# Altium footprint library microbuilder.PCBLIB: 422 footprints (part 22 of 27)
Each footprint in its own frame and in the unit in brackets; x right, y up, seen from the top. Pads: shape width x height; smd on the part's side, far side on the other; paste and mask are expansions set on the pad; w line width, h text height; cw(c..) or ccw(c..) is an arc to the next point about the centre after c.
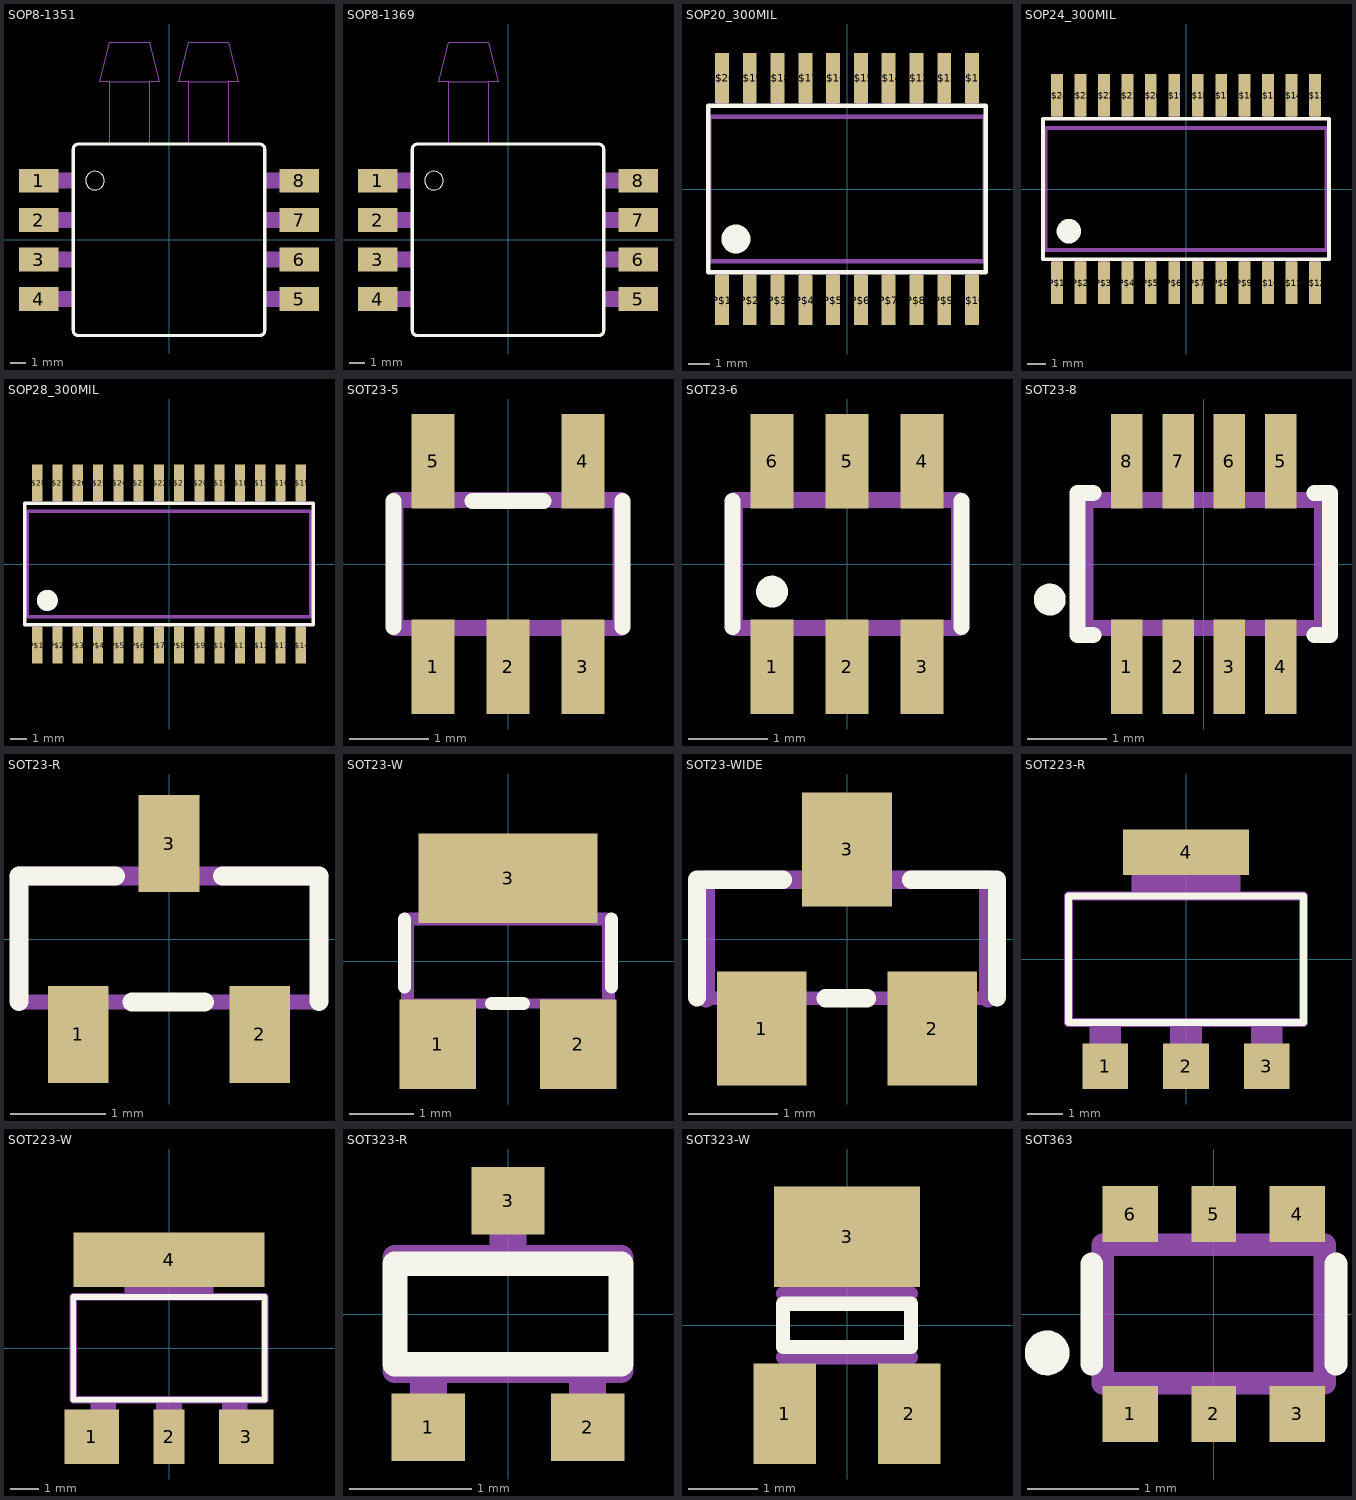
[diagram p21: the footprints below, top view; thin cyan lines are the x and y axes]

## SOP8-1351 [mil]
pads (8):
  rect 100x60 smd: 1(-330,150) 2(-330,50) 3(-330,-50) 4(-330,-150) 5(330,-150) 6(330,-50) 7(330,50) 8(330,150)
Top Overlay:
  circle w0: c-187.5,150 r23.58
  lines w8: -242.5,-230 ccw(c-230,-230) -230,-242.5 230,-242.5 ccw(c230,-230) 242.5,-230 242.5,230 ccw(c230,230) 230,242.5 -230,242.5 ccw(c-230,230) -242.5,230 -242.5,-230
Mechanical 16:
  rectangle: -350,130 -245,170
  region: 350,170 245,170 245,130 350,130
  rectangle: -350,30 -245,70
  rectangle: -350,-70 -245,-30
  rectangle: -350,-170 -245,-130
  region: 350,70 245,70 245,30 350,30
  region: 350,-30 245,-30 245,-70 350,-70
  region: 350,-130 245,-130 245,-170 350,-170
  lines w2: -150,245 -150,400 ; -50,245 -50,400 ; 50,245 50,400 ; 150,245 150,400 ; -150,400 -175,400 -150,500 -50,500 -25,400 -50,400 ; -150,400 -50,400 ; 50,400 25,400 50,500 150,500 175,400 150,400 ; 50,400 150,400

## SOP8-1369 [mil]
pads (8):
  rect 100x60 smd: 1(-330,150) 2(-330,50) 3(-330,-50) 4(-330,-150) 5(330,-150) 6(330,-50) 7(330,50) 8(330,150)
Top Overlay:
  circle w0: c-187.5,150 r23.58
  lines w8: -242.5,-230 ccw(c-230,-230) -230,-242.5 230,-242.5 ccw(c230,-230) 242.5,-230 242.5,230 ccw(c230,230) 230,242.5 -230,242.5 ccw(c-230,230) -242.5,230 -242.5,-230
Mechanical 16:
  rectangle: -350,130 -245,170
  region: 350,170 245,170 245,130 350,130
  rectangle: -350,30 -245,70
  rectangle: -350,-70 -245,-30
  rectangle: -350,-170 -245,-130
  region: 350,70 245,70 245,30 350,30
  region: 350,-30 245,-30 245,-70 350,-70
  region: 350,-130 245,-130 245,-170 350,-170
  lines w2: -150,245 -150,400 ; -50,245 -50,400 ; -150,400 -175,400 -150,500 -50,500 -25,400 -50,400 ; -150,400 -50,400

## SOP20_300MIL [mil]
pads (20):
  rect 25x90 smd: P$1(-225,-200) P$2(-175,-200) P$3(-125,-200) P$4(-75,-200) P$5(-25,-200) P$6(25,-200) P$7(75,-200) P$8(125,-200) P$9(175,-200) P$10(225,-200) P$11(225,200) P$12(175,200) P$13(125,200) P$14(75,200) P$15(25,200) P$16(-25,200) P$17(-75,200) P$18(-125,200) P$19(-175,200) P$20(-225,200)
Top Overlay:
  circle w32: c-200,-90 r10
  lines w8: -250,-150 -250,150 250,150 250,-150 -250,-150
Mechanical 16:
  rectangle: -235,-220 -215,-152.5
  rectangle: -185,-220 -165,-152.5
  rectangle: -135,-220 -115,-152.5
  rectangle: -85,-220 -65,-152.5
  rectangle: -35,-220 -15,-152.5
  rectangle: 15,-220 35,-152.5
  rectangle: 65,-220 85,-152.5
  rectangle: 115,-220 135,-152.5
  rectangle: 165,-220 185,-152.5
  rectangle: 215,-220 235,-152.5
  region: 235,220 215,220 215,152.5 235,152.5
  region: 185,220 165,220 165,152.5 185,152.5
  region: 135,220 115,220 115,152.5 135,152.5
  region: 85,220 65,220 65,152.5 85,152.5
  region: 35,220 15,220 15,152.5 35,152.5
  region: -15,220 -35,220 -35,152.5 -15,152.5
  region: -65,220 -85,220 -85,152.5 -65,152.5
  region: -115,220 -135,220 -135,152.5 -115,152.5
  region: -165,220 -185,220 -185,152.5 -165,152.5
  region: -215,220 -235,220 -235,152.5 -215,152.5
  lines w5: -250,-150 -250,150 250,150 250,-150 -250,-150
  lines w8: -248,-130 -248,130 248,130 248,-130 -248,-130

## SOP24_300MIL [mil]
pads (24):
  rect 25x90 smd: P$1(-275,-200) P$2(-225,-200) P$3(-175,-200) P$4(-125,-200) P$5(-75,-200) P$6(-25,-200) P$7(25,-200) P$8(75,-200) P$9(125,-200) P$10(175,-200) P$11(225,-200) P$12(275,-200) P$13(275,200) P$14(225,200) P$15(175,200) P$16(125,200) P$17(75,200) P$18(25,200) P$19(-25,200) P$20(-75,200) P$21(-125,200) P$22(-175,200) P$23(-225,200) P$24(-275,200)
Top Overlay:
  circle w32: c-250,-90 r10
  lines w8: -305,-150 -305,150 305,150 305,-150 -305,-150
Mechanical 16:
  rectangle: -285,-220 -265,-152.5
  rectangle: -235,-220 -215,-152.5
  rectangle: -185,-220 -165,-152.5
  rectangle: -135,-220 -115,-152.5
  rectangle: -85,-220 -65,-152.5
  rectangle: -35,-220 -15,-152.5
  rectangle: 15,-220 35,-152.5
  rectangle: 65,-220 85,-152.5
  rectangle: 115,-220 135,-152.5
  rectangle: 165,-220 185,-152.5
  rectangle: 215,-220 235,-152.5
  rectangle: 265,-220 285,-152.5
  region: 285,220 265,220 265,152.5 285,152.5
  region: 235,220 215,220 215,152.5 235,152.5
  region: 185,220 165,220 165,152.5 185,152.5
  region: 135,220 115,220 115,152.5 135,152.5
  region: 85,220 65,220 65,152.5 85,152.5
  region: 35,220 15,220 15,152.5 35,152.5
  region: -15,220 -35,220 -35,152.5 -15,152.5
  region: -65,220 -85,220 -85,152.5 -65,152.5
  region: -115,220 -135,220 -135,152.5 -115,152.5
  region: -165,220 -185,220 -185,152.5 -165,152.5
  region: -215,220 -235,220 -235,152.5 -215,152.5
  region: -265,220 -285,220 -285,152.5 -265,152.5
  lines w5: -305,-150 -305,150 305,150 305,-150 -305,-150
  lines w8: -299,-130 -299,130 299,130 299,-130 -299,-130

## SOP28_300MIL [mil]
pads (28):
  rect 25x90 smd: P$1(-325,-200) P$2(-275,-200) P$3(-225,-200) P$4(-175,-200) P$5(-125,-200) P$6(-75,-200) P$7(-25,-200) P$8(25,-200) P$9(75,-200) P$10(125,-200) P$11(175,-200) P$12(225,-200) P$13(275,-200) P$14(325,-200) P$15(325,200) P$16(275,200) P$17(225,200) P$18(175,200) P$19(125,200) P$20(75,200) P$21(25,200) P$22(-25,200) P$23(-75,200) P$24(-125,200) P$25(-175,200) P$26(-225,200) P$27(-275,200) P$28(-325,200)
Top Overlay:
  circle w32: c-300,-90 r10
  lines w8: -356,-150 356,-150 356,150 -356,150 -356,-150
Mechanical 16:
  region: -315,220 -335,220 -335,152.5 -315,152.5
  region: -265,220 -285,220 -285,152.5 -265,152.5
  region: -215,220 -235,220 -235,152.5 -215,152.5
  region: -165,220 -185,220 -185,152.5 -165,152.5
  region: -115,220 -135,220 -135,152.5 -115,152.5
  region: -65,220 -85,220 -85,152.5 -65,152.5
  region: -15,220 -35,220 -35,152.5 -15,152.5
  region: 35,220 15,220 15,152.5 35,152.5
  region: 85,220 65,220 65,152.5 85,152.5
  region: 135,220 115,220 115,152.5 135,152.5
  region: 185,220 165,220 165,152.5 185,152.5
  region: 235,220 215,220 215,152.5 235,152.5
  region: 285,220 265,220 265,152.5 285,152.5
  region: 335,220 315,220 315,152.5 335,152.5
  rectangle: 315,-220 335,-152.5
  rectangle: 265,-220 285,-152.5
  rectangle: 215,-220 235,-152.5
  rectangle: 165,-220 185,-152.5
  rectangle: 115,-220 135,-152.5
  rectangle: 65,-220 85,-152.5
  rectangle: 15,-220 35,-152.5
  rectangle: -35,-220 -15,-152.5
  rectangle: -85,-220 -65,-152.5
  rectangle: -135,-220 -115,-152.5
  rectangle: -185,-220 -165,-152.5
  rectangle: -235,-220 -215,-152.5
  rectangle: -285,-220 -265,-152.5
  rectangle: -335,-220 -315,-152.5
  lines w5: -356,-150 356,-150 356,150 -356,150 -356,-150
  lines w8: -349,-130 349,-130 349,130 -349,130 -349,-130

## SOT23-5 [mm]
pads (5):
  rect 0.55x1.2 smd: 1(-0.95,-1.3) 2(0,-1.3) 3(0.95,-1.3) 4(0.95,1.3) 5(-0.95,1.3)
Top Overlay:
  lines w0.203: -1.45,-0.8 -1.45,0.8 ; -0.45,0.8 0.45,0.8 ; 1.45,-0.8 1.45,0.8
Mechanical 16:
  rectangle: -1.2,0.85 -0.7,1.5
  rectangle: 0.7,0.85 1.2,1.5
  rectangle: 0.7,-1.5 1.2,-0.85
  rectangle: -0.25,-1.5 0.25,-0.85
  rectangle: -1.2,-1.5 -0.7,-0.85
  lines w0.203: -1.422,-0.811 -1.422,0.811 1.422,0.811 1.422,-0.811 -1.422,-0.811

## SOT23-6 [mm]
pads (6):
  rect 0.55x1.2 smd: 1(-0.95,-1.3) 2(0,-1.3) 3(0.95,-1.3) 4(0.95,1.3) 5(0,1.3) 6(-0.95,1.3)
Top Overlay:
  circle w0.203: c-0.95,-0.35 r0.1
  lines w0.203: -1.45,-0.8 -1.45,0.8 ; 1.45,-0.8 1.45,0.8
Mechanical 16:
  rectangle: -1.2,-1.5 -0.7,-0.85
  rectangle: -0.25,-1.5 0.25,-0.85
  rectangle: 0.7,-1.5 1.2,-0.85
  rectangle: 0.7,0.85 1.2,1.5
  rectangle: -0.25,0.85 0.25,1.5
  rectangle: -1.2,0.85 -0.7,1.5
  lines w0.203: -1.422,-0.81 1.422,-0.81 1.422,0.81 -1.422,0.81 -1.422,-0.81

## SOT23-8 [mm]
pads (8):
  rect 0.4x1.2 smd: 1(-0.975,-1.3) 2(-0.325,-1.3) 3(0.325,-1.3) 4(0.975,-1.3) 5(0.975,1.3) 6(0.325,1.3) 7(-0.325,1.3) 8(-0.975,1.3)
Top Overlay:
  circle w0.203: c-1.95,-0.45 r0.1
  lines w0.203: -1.4,-0.9 -1.6,-0.9 -1.6,0.9 -1.4,0.9 ; 1.4,-0.9 1.6,-0.9 1.6,0.9 1.4,0.9
Mechanical 16:
  rectangle: -1.165,0.875 -0.785,1.5
  rectangle: -1.165,-1.5 -0.785,-0.875
  rectangle: -0.515,-1.5 -0.135,-0.875
  rectangle: 0.135,-1.5 0.515,-0.875
  rectangle: 0.785,-1.5 1.165,-0.875
  rectangle: 0.785,0.875 1.165,1.5
  rectangle: 0.135,0.875 0.515,1.5
  rectangle: -0.515,0.875 -0.135,1.5
  lines w0.203: -1.5,-0.81 1.5,-0.81 1.5,0.81 -1.5,0.81 -1.5,-0.81

## SOT23-R [mm]
pads (3):
  rect 0.635x1.016 smd: 1(-0.95,-1) 2(0.95,-1) 3(0,1)
Top Overlay:
  lines w0.203: -1.573,-0.653 -1.573,0.66 -0.564,0.66 ; -0.386,-0.66 0.372,-0.66 ; 0.564,0.66 1.573,0.66 1.573,-0.653
Mechanical 16:
  rectangle: -1.168,-1.295 -0.711,-0.711
  rectangle: 0.711,-1.295 1.168,-0.711
  rectangle: -0.229,0.711 0.229,1.295
  lines w0.152: -1.573,0.66 -1.573,-0.66 1.573,-0.66 1.573,0.66
  lines w0.203: -1.573,0.66 1.573,0.66

## SOT23-W [mm]
pads (3):
  rect 1.2x1.4 smd: 1(-1.1,-1.3) 2(1.1,-1.3)
  rect 2.8x1.4 smd: 3(0,1.3)
Top Overlay:
  lines w0.203: -1.622,-0.399 -1.622,0.66 ; -0.259,-0.66 0.245,-0.66 ; 1.622,-0.399 1.622,0.66
Mechanical 16:
  rectangle: -1.168,-1.295 -0.711,-0.711
  rectangle: 0.711,-1.295 1.168,-0.711
  rectangle: -0.229,0.711 0.229,1.295
  lines w0.152: -1.573,-0.66 1.573,-0.66
  lines w0.203: -1.573,-0.66 -1.573,0.66 1.573,0.66 1.573,-0.66

## SOT23-WIDE [mm]
pads (3):
  rect 1x1.27 smd: 1(-0.95,-1) 2(0.95,-1) 3(0,1)
Top Overlay:
  lines w0.203: -1.672,-0.653 -1.672,0.66 -0.713,0.66 ; -0.236,-0.66 0.223,-0.66 ; 0.713,0.66 1.672,0.66 1.672,-0.653
Mechanical 16:
  rectangle: -0.229,0.711 0.229,1.295
  rectangle: 0.711,-1.295 1.168,-0.711
  rectangle: -1.168,-1.295 -0.711,-0.711
  lines w0.152: -1.573,-0.66 1.573,-0.66
  lines w0.203: -1.573,-0.66 -1.573,0.66 1.573,0.66 1.573,-0.66

## SOT223-R [mm]
pads (4):
  rect 1.3x1.3 smd: 1(-2.3,-3.05) 2(0,-3.05) 3(2.3,-3.05)
  rect 3.6x1.3 smd: 4(0,3.05)
Top Overlay:
  lines w0.203: -3.35,-1.8 -3.35,1.8 3.35,1.8 3.35,-1.8 ; -3.278,-1.8 0.724,-1.8 ; 0.8,-1.8 3.278,-1.8
Mechanical 16:
  rectangle: -2.75,-3.45 -1.85,-1.9
  rectangle: -0.45,-3.45 0.45,-1.9
  rectangle: 1.85,-3.45 2.75,-1.9
  rectangle: -1.55,1.9 1.55,3.45
  lines w0.254: -3.35,-1.8 -3.35,1.8 3.35,1.8 3.35,-1.8 -3.35,-1.8

## SOT223-W [mm]
pads (4):
  rect 1.9x1.9 smd: 1(-2.7,-3.1) 3(2.7,-3.1)
  rect 1.1x1.9 smd: 2(0,-3.1)
  rect 6.7x1.9 smd: 4(0,3.1)
Top Overlay:
  lines w0.203: -3.35,-1.8 -3.35,1.8 1.85,1.8 1.96,1.8 3.35,1.8 3.35,-1.8 ; -3.278,-1.8 0.724,-1.8 ; 0.8,-1.8 3.278,-1.8
Mechanical 16:
  rectangle: -2.75,-3.45 -1.85,-1.9
  rectangle: -0.45,-3.45 0.45,-1.9
  rectangle: 1.85,-3.45 2.75,-1.9
  rectangle: -1.55,1.9 1.55,3.45
  lines w0.254: -3.35,-1.8 -3.35,1.8 3.35,1.8 3.35,-1.8 -3.35,-1.8

## SOT323-R [mm]
pads (3):
  rect 0.6x0.55 smd: 1(-0.65,-0.925) 2(0.65,-0.925) 3(0,0.925)
Top Overlay:
  lines w0.203: -0.923,-0.41 0.923,-0.41 0.923,0.41 -0.923,0.41 -0.923,-0.41
Mechanical 16:
  rectangle: -0.8,-1.1 -0.5,-0.5
  rectangle: 0.5,-1.1 0.8,-0.5
  rectangle: -0.15,0.5 0.15,1.1
  lines w0.152: -0.923,-0.461 -0.923,0.461 ; 0.923,-0.461 0.923,0.461
  lines w0.203: -0.923,-0.461 0.923,-0.461 ; -0.923,0.461 0.923,0.461

## SOT323-W [mm]
pads (3):
  rect 0.9x1.45 smd: 1(-0.9,-1.275) 2(0.9,-1.275)
  rect 2.1x1.45 smd: 3(0,1.275)
Top Overlay:
  lines w0.203: -0.923,-0.31 0.923,-0.31 0.923,0.31 -0.923,0.31 -0.923,-0.31
Mechanical 16:
  rectangle: -0.8,-1.1 -0.5,-0.5
  rectangle: 0.5,-1.1 0.8,-0.5
  rectangle: -0.15,0.5 0.15,1.1
  lines w0.152: -0.923,-0.461 -0.923,0.461 ; 0.923,-0.461 0.923,0.461
  lines w0.203: -0.923,-0.461 0.923,-0.461 ; -0.923,0.461 0.923,0.461

## SOT363 [mm]
pads (6):
  rect 0.5x0.5 smd: 1(-0.75,-0.9) 3(0.75,-0.9) 4(0.75,0.9) 6(-0.75,0.9)
  rect 0.4x0.5 smd: 2(0,-0.9) 5(0,0.9)
Top Overlay:
  circle w0.203: c-1.5,-0.35 r0.1
  lines w0.203: -1.1,-0.45 -1.1,0.45 ; 1.1,-0.45 1.1,0.45
Mechanical 16:
  rectangle: -0.125,-1.05 0.125,-0.7
  rectangle: -0.775,-1.05 -0.525,-0.7
  rectangle: 0.525,-1.05 0.775,-0.7
  rectangle: -0.775,0.7 -0.525,1.05
  rectangle: -0.125,0.7 0.125,1.05
  rectangle: 0.525,0.7 0.775,1.05
  lines w0.203: -1,-0.625 1,-0.625 1,0.625 -1,0.625 -1,-0.625